# Altium schematic symbol library jlcpcb_2025_04_capacitors_extended_1206.schlib: 2503 symbols (part 13 of 14) (continued)
## TCC1206COG560J102ET
designator C?  Capacitance: 56pF  (hidden comment: *)
Capacitor, Ceramic (MLCC), 56pF, ±5%, 1kV, C0G, ±5%, SMD 1206; Manufacturer: CCTC; Manufacturer Part Number: TCC1206COG560J102ET; Package Size: 1206; JLCPCB Basic Part: No; JLCPCB Part Number: C377041; Supplier 1: LCSC; Category: Capacitors - MLCC; Supplier Part Number 1: C377041; Tolerance: ±5%; Voltage Rating: 1kV; Temperature Coefficient: C0G; RoHS: Yes; ComponentLink1Description: Datasheet; ComponentLink1URL: https://wmsc.lcsc.com/wmsc/upload/file/pdf/v2/lcsc/2304140030_CCTC-TCC1206COG560J102ET_C377041.pdf; ComponentLink2Description: JLCPCB Part URL; ComponentLink2URL: https://jlcpcb.com/partdetail/C377041; ComponentLink3Description: LCSC Part URL; ComponentLink3URL: https://lcsc.com/product-detail/Multilayer-Ceramic-Capacitors-MLCC---SMD-SMT_CCTC-CCTC-TCC1206COG560J102ET_C377041.html
footprint CAP-1206 (1206 (3216M) Capacitor)
pins: 1, 2

## TCC1206COG680J102DT
designator C?  Capacitance: 68pF  (hidden comment: *)
Capacitor, Ceramic (MLCC), 68pF, ±5%, 1kV, C0G, ±5%, SMD 1206; Manufacturer: CCTC; Manufacturer Part Number: TCC1206COG680J102DT; Package Size: 1206; JLCPCB Basic Part: No; JLCPCB Part Number: C377042; Supplier 1: LCSC; Category: Capacitors - MLCC; Supplier Part Number 1: C377042; Tolerance: ±5%; Voltage Rating: 1kV; Temperature Coefficient: C0G; RoHS: Yes; ComponentLink1Description: Datasheet; ComponentLink1URL: https://wmsc.lcsc.com/wmsc/upload/file/pdf/v2/lcsc/2304140030_CCTC-TCC1206COG680J102DT_C377042.pdf; ComponentLink2Description: JLCPCB Part URL; ComponentLink2URL: https://jlcpcb.com/partdetail/C377042; ComponentLink3Description: LCSC Part URL; ComponentLink3URL: https://lcsc.com/product-detail/Multilayer-Ceramic-Capacitors-MLCC---SMD-SMT_CCTC-CCTC-TCC1206COG680J102DT_C377042.html
footprint CAP-1206 (1206 (3216M) Capacitor)
pins: 1, 2

## TCC1206COG680J102ET
designator C?  Capacitance: 68pF  (hidden comment: *)
Capacitor, Ceramic (MLCC), 68pF, ±5%, 1kV, C0G, ±5%, SMD 1206; Manufacturer: CCTC; Manufacturer Part Number: TCC1206COG680J102ET; Package Size: 1206; JLCPCB Basic Part: No; JLCPCB Part Number: C377043; Supplier 1: LCSC; Category: Capacitors - MLCC; Supplier Part Number 1: C377043; Tolerance: ±5%; Voltage Rating: 1kV; Temperature Coefficient: C0G; RoHS: Yes; ComponentLink1Description: Datasheet; ComponentLink1URL: https://wmsc.lcsc.com/wmsc/upload/file/pdf/v2/lcsc/2304140030_CCTC-TCC1206COG680J102ET_C377043.pdf; ComponentLink2Description: JLCPCB Part URL; ComponentLink2URL: https://jlcpcb.com/partdetail/C377043; ComponentLink3Description: LCSC Part URL; ComponentLink3URL: https://lcsc.com/product-detail/Multilayer-Ceramic-Capacitors-MLCC---SMD-SMT_CCTC-CCTC-TCC1206COG680J102ET_C377043.html
footprint CAP-1206 (1206 (3216M) Capacitor)
pins: 1, 2

## TCC1206COG680J500DT
designator C?  Capacitance: 68pF  (hidden comment: *)
Capacitor, Ceramic (MLCC), 68pF, ±5%, 50V, C0G, ±5%, SMD 1206; Manufacturer: CCTC; Manufacturer Part Number: TCC1206COG680J500DT; Package Size: 1206; JLCPCB Basic Part: No; JLCPCB Part Number: C377044; Supplier 1: LCSC; Category: Capacitors - MLCC; Supplier Part Number 1: C377044; Tolerance: ±5%; Voltage Rating: 50V; Temperature Coefficient: C0G; RoHS: Yes; ComponentLink1Description: Datasheet; ComponentLink1URL: https://wmsc.lcsc.com/wmsc/upload/file/pdf/v2/lcsc/2304140030_CCTC-TCC1206COG680J500DT_C377044.pdf; ComponentLink2Description: JLCPCB Part URL; ComponentLink2URL: https://jlcpcb.com/partdetail/C377044; ComponentLink3Description: LCSC Part URL; ComponentLink3URL: https://lcsc.com/product-detail/Multilayer-Ceramic-Capacitors-MLCC---SMD-SMT_CCTC-CCTC-TCC1206COG680J500DT_C377044.html
footprint CAP-1206 (1206 (3216M) Capacitor)
pins: 1, 2

## TCC1206COG681J500DT
designator C?  Capacitance: 680pF  (hidden comment: *)
Capacitor, Ceramic (MLCC), 680pF, ±5%, 50V, C0G, ±5%, SMD 1206; Manufacturer: CCTC; Manufacturer Part Number: TCC1206COG681J500DT; Package Size: 1206; JLCPCB Basic Part: No; JLCPCB Part Number: C282803; Supplier 1: LCSC; Category: Capacitors - MLCC; Supplier Part Number 1: C282803; Tolerance: ±5%; Voltage Rating: 50V; Temperature Coefficient: C0G; RoHS: Yes; ComponentLink1Description: Datasheet; ComponentLink1URL: https://wmsc.lcsc.com/wmsc/upload/file/pdf/v2/lcsc/2304140030_CCTC-TCC1206COG681J500DT_C282803.pdf; ComponentLink2Description: JLCPCB Part URL; ComponentLink2URL: https://jlcpcb.com/partdetail/C282803; ComponentLink3Description: LCSC Part URL; ComponentLink3URL: https://lcsc.com/product-detail/Multilayer-Ceramic-Capacitors-MLCC---SMD-SMT_CCTC-CCTC-TCC1206COG681J500DT_C282803.html
footprint CAP-1206 (1206 (3216M) Capacitor)
pins: 1, 2

## TCC1206COG820J500DT
designator C?  Capacitance: 82pF  (hidden comment: *)
Capacitor, Ceramic (MLCC), 82pF, ±5%, 50V, C0G, ±5%, SMD 1206; Manufacturer: CCTC; Manufacturer Part Number: TCC1206COG820J500DT; Package Size: 1206; JLCPCB Basic Part: No; JLCPCB Part Number: C282806; Supplier 1: LCSC; Category: Capacitors - MLCC; Supplier Part Number 1: C282806; Tolerance: ±5%; Voltage Rating: 50V; Temperature Coefficient: C0G; RoHS: Yes; ComponentLink1Description: Datasheet; ComponentLink1URL: https://wmsc.lcsc.com/wmsc/upload/file/pdf/v2/lcsc/2304140030_CCTC-TCC1206COG820J500DT_C282806.pdf; ComponentLink2Description: JLCPCB Part URL; ComponentLink2URL: https://jlcpcb.com/partdetail/C282806; ComponentLink3Description: LCSC Part URL; ComponentLink3URL: https://lcsc.com/product-detail/Multilayer-Ceramic-Capacitors-MLCC---SMD-SMT_CCTC-CCTC-TCC1206COG820J500DT_C282806.html
footprint CAP-1206 (1206 (3216M) Capacitor)
pins: 1, 2

## TCC1206M3L104J500FT
designator C?  Capacitance: 100nF  (hidden comment: *)
Capacitor, Ceramic (MLCC), 100nF, ±5%, 50V, M3L, ±5%, SMD 1206; Manufacturer: CCTC; Manufacturer Part Number: TCC1206M3L104J500FT; Package Size: 1206; JLCPCB Basic Part: No; JLCPCB Part Number: C359189; Supplier 1: LCSC; Category: Capacitors - MLCC; Supplier Part Number 1: C359189; Tolerance: ±5%; Voltage Rating: 50V; Temperature Coefficient: M3L; RoHS: Yes; ComponentLink1Description: Datasheet; ComponentLink1URL: https://wmsc.lcsc.com/wmsc/upload/file/pdf/v2/lcsc/1912111437_CCTC-TCC1206M3L104J500FT_C359189.pdf; ComponentLink2Description: JLCPCB Part URL; ComponentLink2URL: https://jlcpcb.com/partdetail/C359189; ComponentLink3Description: LCSC Part URL; ComponentLink3URL: https://lcsc.com/product-detail/Multilayer-Ceramic-Capacitors-MLCC---SMD-SMT_CCTC-CCTC-TCC1206M3L104J500FT_C359189.html
footprint CAP-1206 (1206 (3216M) Capacitor)
pins: 1, 2

## TCC1206M3L473J500FT
designator C?  Capacitance: 47nF  (hidden comment: *)
Capacitor, Ceramic (MLCC), 47nF, ±5%, 50V, M3L, ±5%, SMD 1206; Manufacturer: CCTC; Manufacturer Part Number: TCC1206M3L473J500FT; Package Size: 1206; JLCPCB Basic Part: No; JLCPCB Part Number: C2903670; Supplier 1: LCSC; Category: Capacitors - MLCC; Supplier Part Number 1: C2903670; Tolerance: ±5%; Voltage Rating: 50V; Temperature Coefficient: M3L; RoHS: Yes; ComponentLink1Description: Datasheet; ComponentLink1URL: https://wmsc.lcsc.com/wmsc/upload/file/pdf/v2/lcsc/2110101130_CCTC-TCC1206M3L473J500FT_C2903670.pdf; ComponentLink2Description: JLCPCB Part URL; ComponentLink2URL: https://jlcpcb.com/partdetail/C2903670; ComponentLink3Description: LCSC Part URL; ComponentLink3URL: https://lcsc.com/product-detail/Multilayer-Ceramic-Capacitors-MLCC---SMD-SMT_CCTC-CCTC-TCC1206M3L473J500FT_C2903670.html
footprint CAP-1206 (1206 (3216M) Capacitor)
pins: 1, 2

## TCC1206M3L823J500FT
designator C?  Capacitance: 82nF  (hidden comment: *)
Capacitor, Ceramic (MLCC), 82nF, ±5%, 50V, M3L, ±5%, SMD 1206; Manufacturer: CCTC; Manufacturer Part Number: TCC1206M3L823J500FT; Package Size: 1206; JLCPCB Basic Part: No; JLCPCB Part Number: C7393979; Supplier 1: LCSC; Category: Capacitors - MLCC; Supplier Part Number 1: C7393979; Tolerance: ±5%; Voltage Rating: 50V; Temperature Coefficient: M3L; RoHS: Yes; ComponentLink1Description: Datasheet; ComponentLink1URL: https://wmsc.lcsc.com/wmsc/upload/file/pdf/v2/lcsc/2306211528_CCTC-TCC1206M3L823J500FT_C7393979.pdf; ComponentLink2Description: JLCPCB Part URL; ComponentLink2URL: https://jlcpcb.com/partdetail/C7393979; ComponentLink3Description: LCSC Part URL; ComponentLink3URL: https://lcsc.com/product-detail/Multilayer-Ceramic-Capacitors-MLCC---SMD-SMT_CCTC-CCTC-TCC1206M3L823J500FT_C7393979.html
footprint CAP-1206 (1206 (3216M) Capacitor)
pins: 1, 2

## TCC1206X5R226K160HT
designator C?  Capacitance: 22uF  (hidden comment: *)
Capacitor, Ceramic (MLCC), 22uF, ±10%, 16V, X5R, ±10%, SMD 1206; Manufacturer: CCTC; Manufacturer Part Number: TCC1206X5R226K160HT; Package Size: 1206; JLCPCB Basic Part: No; JLCPCB Part Number: C5448976; Supplier 1: LCSC; Category: Capacitors - MLCC; Supplier Part Number 1: C5448976; Tolerance: ±10%; Voltage Rating: 16V; Temperature Coefficient: X5R; RoHS: Yes; ComponentLink1Description: Datasheet; ComponentLink1URL: https://wmsc.lcsc.com/wmsc/upload/file/pdf/v2/lcsc/2403281713_CCTC-TCC1206X5R226K160HT_C5448976.pdf; ComponentLink2Description: JLCPCB Part URL; ComponentLink2URL: https://jlcpcb.com/partdetail/C5448976; ComponentLink3Description: LCSC Part URL; ComponentLink3URL: https://lcsc.com/product-detail/Multilayer-Ceramic-Capacitors-MLCC---SMD-SMT_CCTC-CCTC-TCC1206X5R226K160HT_C5448976.html
footprint CAP-1206 (1206 (3216M) Capacitor)
pins: 1, 2

## TCC1206X5R226K250HT
designator C?  Capacitance: 22uF  (hidden comment: *)
Capacitor, Ceramic (MLCC), 22uF, ±10%, 25V, X5R, ±10%, SMD 1206; Manufacturer: CCTC; Manufacturer Part Number: TCC1206X5R226K250HT; Package Size: 1206; JLCPCB Basic Part: No; JLCPCB Part Number: C5448922; Supplier 1: LCSC; Category: Capacitors - MLCC; Supplier Part Number 1: C5448922; Tolerance: ±10%; Voltage Rating: 25V; Temperature Coefficient: X5R; RoHS: Yes; ComponentLink1Description: Datasheet; ComponentLink1URL: https://wmsc.lcsc.com/wmsc/upload/file/pdf/v2/lcsc/2403281712_CCTC-TCC1206X5R226K250HT_C5448922.pdf; ComponentLink2Description: JLCPCB Part URL; ComponentLink2URL: https://jlcpcb.com/partdetail/C5448922; ComponentLink3Description: LCSC Part URL; ComponentLink3URL: https://lcsc.com/product-detail/Multilayer-Ceramic-Capacitors-MLCC---SMD-SMT_CCTC-CCTC-TCC1206X5R226K250HT_C5448922.html
footprint CAP-1206 (1206 (3216M) Capacitor)
pins: 1, 2

## TCC1206X5R475K160HT
designator C?  Capacitance: 4.7uF  (hidden comment: *)
Capacitor, Ceramic (MLCC), 4.7uF, ±10%, 16V, X5R, ±10%, SMD 1206; Manufacturer: CCTC; Manufacturer Part Number: TCC1206X5R475K160HT; Package Size: 1206; JLCPCB Basic Part: No; JLCPCB Part Number: C380360; Supplier 1: LCSC; Category: Capacitors - MLCC; Supplier Part Number 1: C380360; Tolerance: ±10%; Voltage Rating: 16V; Temperature Coefficient: X5R; RoHS: Yes; ComponentLink1Description: Datasheet; ComponentLink1URL: https://wmsc.lcsc.com/wmsc/upload/file/pdf/v2/lcsc/2304140030_CCTC-TCC1206X5R475K160HT_C380360.pdf; ComponentLink2Description: JLCPCB Part URL; ComponentLink2URL: https://jlcpcb.com/partdetail/C380360; ComponentLink3Description: LCSC Part URL; ComponentLink3URL: https://lcsc.com/product-detail/Multilayer-Ceramic-Capacitors-MLCC---SMD-SMT_CCTC-CCTC-TCC1206X5R475K160HT_C380360.html
footprint CAP-1206 (1206 (3216M) Capacitor)
pins: 1, 2

## TCC1206X5R475K250HT
designator C?  Capacitance: 4.7uF  (hidden comment: *)
Capacitor, Ceramic (MLCC), 4.7uF, ±10%, 25V, X5R, ±10%, SMD 1206; Manufacturer: CCTC; Manufacturer Part Number: TCC1206X5R475K250HT; Package Size: 1206; JLCPCB Basic Part: No; JLCPCB Part Number: C282809; Supplier 1: LCSC; Category: Capacitors - MLCC; Supplier Part Number 1: C282809; Tolerance: ±10%; Voltage Rating: 25V; Temperature Coefficient: X5R; RoHS: Yes; ComponentLink1Description: Datasheet; ComponentLink1URL: https://wmsc.lcsc.com/wmsc/upload/file/pdf/v2/lcsc/2304140030_CCTC-TCC1206X5R475K250HT_C282809.pdf; ComponentLink2Description: JLCPCB Part URL; ComponentLink2URL: https://jlcpcb.com/partdetail/C282809; ComponentLink3Description: LCSC Part URL; ComponentLink3URL: https://lcsc.com/product-detail/Multilayer-Ceramic-Capacitors-MLCC---SMD-SMT_CCTC-CCTC-TCC1206X5R475K250HT_C282809.html
footprint CAP-1206 (1206 (3216M) Capacitor)
pins: 1, 2

## TCC1206X5R476K100HT
designator C?  Capacitance: 47uF  (hidden comment: *)
Capacitor, Ceramic (MLCC), 47uF, ±10%, 10V, X5R, ±10%, SMD 1206; Manufacturer: CCTC; Manufacturer Part Number: TCC1206X5R476K100HT; Package Size: 1206; JLCPCB Basic Part: No; JLCPCB Part Number: C5449028; Supplier 1: LCSC; Category: Capacitors - MLCC; Supplier Part Number 1: C5449028; Tolerance: ±10%; Voltage Rating: 10V; Temperature Coefficient: X5R; RoHS: Yes; ComponentLink1Description: Datasheet; ComponentLink1URL: https://wmsc.lcsc.com/wmsc/upload/file/pdf/v2/lcsc/2403281713_CCTC-TCC1206X5R476K100HT_C5449028.pdf; ComponentLink2Description: JLCPCB Part URL; ComponentLink2URL: https://jlcpcb.com/partdetail/C5449028; ComponentLink3Description: LCSC Part URL; ComponentLink3URL: https://lcsc.com/product-detail/Multilayer-Ceramic-Capacitors-MLCC---SMD-SMT_CCTC-CCTC-TCC1206X5R476K100HT_C5449028.html
footprint CAP-1206 (1206 (3216M) Capacitor)
pins: 1, 2

## TCC1206X5R476M6R3HT
designator C?  Capacitance: 47uF  (hidden comment: *)
Capacitor, Ceramic (MLCC), 47uF, ±20%, 6.3V, X5R, ±20%, SMD 1206; Manufacturer: CCTC; Manufacturer Part Number: TCC1206X5R476M6R3HT; Package Size: 1206; JLCPCB Basic Part: No; JLCPCB Part Number: C380361; Supplier 1: LCSC; Category: Capacitors - MLCC; Supplier Part Number 1: C380361; Tolerance: ±20%; Voltage Rating: 6.3V; Temperature Coefficient: X5R; RoHS: Yes; ComponentLink1Description: Datasheet; ComponentLink1URL: https://wmsc.lcsc.com/wmsc/upload/file/pdf/v2/lcsc/2304140030_CCTC-TCC1206X5R476M6R3HT_C380361.pdf; ComponentLink2Description: JLCPCB Part URL; ComponentLink2URL: https://jlcpcb.com/partdetail/C380361; ComponentLink3Description: LCSC Part URL; ComponentLink3URL: https://lcsc.com/product-detail/Multilayer-Ceramic-Capacitors-MLCC---SMD-SMT_CCTC-CCTC-TCC1206X5R476M6R3HT_C380361.html
footprint CAP-1206 (1206 (3216M) Capacitor)
pins: 1, 2

## TCC1206X5R685K250HT
designator C?  Capacitance: 6.8uF  (hidden comment: *)
Capacitor, Ceramic (MLCC), 6.8uF, ±10%, 25V, X5R, ±10%, SMD 1206; Manufacturer: CCTC; Manufacturer Part Number: TCC1206X5R685K250HT; Package Size: 1206; JLCPCB Basic Part: No; JLCPCB Part Number: C7393982; Supplier 1: LCSC; Category: Capacitors - MLCC; Supplier Part Number 1: C7393982; Tolerance: ±10%; Voltage Rating: 25V; Temperature Coefficient: X5R; RoHS: Yes; ComponentLink1Description: Datasheet; ComponentLink1URL: https://wmsc.lcsc.com/wmsc/upload/file/pdf/v2/lcsc/2306211528_CCTC-TCC1206X5R685K250HT_C7393982.pdf; ComponentLink2Description: JLCPCB Part URL; ComponentLink2URL: https://jlcpcb.com/partdetail/C7393982; ComponentLink3Description: LCSC Part URL; ComponentLink3URL: https://lcsc.com/product-detail/Multilayer-Ceramic-Capacitors-MLCC---SMD-SMT_CCTC-CCTC-TCC1206X5R685K250HT_C7393982.html
footprint CAP-1206 (1206 (3216M) Capacitor)
pins: 1, 2

## TCC1206X7R101J102ET
designator C?  Capacitance: 100pF  (hidden comment: *)
Capacitor, Ceramic (MLCC), 100pF, ±5%, 1kV, X7R, ±5%, SMD 1206; Manufacturer: CCTC; Manufacturer Part Number: TCC1206X7R101J102ET; Package Size: 1206; JLCPCB Basic Part: No; JLCPCB Part Number: C377045; Supplier 1: LCSC; Category: Capacitors - MLCC; Supplier Part Number 1: C377045; Tolerance: ±5%; Voltage Rating: 1kV; Temperature Coefficient: X7R; RoHS: Yes; ComponentLink1Description: Datasheet; ComponentLink1URL: https://wmsc.lcsc.com/wmsc/upload/file/pdf/v2/lcsc/2304140030_CCTC-TCC1206X7R101J102ET_C377045.pdf; ComponentLink2Description: JLCPCB Part URL; ComponentLink2URL: https://jlcpcb.com/partdetail/C377045; ComponentLink3Description: LCSC Part URL; ComponentLink3URL: https://lcsc.com/product-detail/Multilayer-Ceramic-Capacitors-MLCC---SMD-SMT_CCTC-CCTC-TCC1206X7R101J102ET_C377045.html
footprint CAP-1206 (1206 (3216M) Capacitor)
pins: 1, 2

## TCC1206X7R101K102DT
designator C?  Capacitance: 100pF  (hidden comment: *)
Capacitor, Ceramic (MLCC), 100pF, ±10%, 1kV, X7R, ±10%, SMD 1206; Manufacturer: CCTC; Manufacturer Part Number: TCC1206X7R101K102DT; Package Size: 1206; JLCPCB Basic Part: No; JLCPCB Part Number: C377046; Supplier 1: LCSC; Category: Capacitors - MLCC; Supplier Part Number 1: C377046; Tolerance: ±10%; Voltage Rating: 1kV; Temperature Coefficient: X7R; RoHS: Yes; ComponentLink1Description: Datasheet; ComponentLink1URL: https://wmsc.lcsc.com/wmsc/upload/file/pdf/v2/lcsc/2304140030_CCTC-TCC1206X7R101K102DT_C377046.pdf; ComponentLink2Description: JLCPCB Part URL; ComponentLink2URL: https://jlcpcb.com/partdetail/C377046; ComponentLink3Description: LCSC Part URL; ComponentLink3URL: https://lcsc.com/product-detail/Multilayer-Ceramic-Capacitors-MLCC---SMD-SMT_CCTC-CCTC-TCC1206X7R101K102DT_C377046.html
footprint CAP-1206 (1206 (3216M) Capacitor)
pins: 1, 2

## TCC1206X7R102K101DT
designator C?  Capacitance: 1nF  (hidden comment: *)
Capacitor, Ceramic (MLCC), 1nF, ±10%, 100V, X7R, ±10%, SMD 1206; Manufacturer: CCTC; Manufacturer Part Number: TCC1206X7R102K101DT; Package Size: 1206; JLCPCB Basic Part: No; JLCPCB Part Number: C282810; Supplier 1: LCSC; Category: Capacitors - MLCC; Supplier Part Number 1: C282810; Tolerance: ±10%; Voltage Rating: 100V; Temperature Coefficient: X7R; RoHS: Yes; ComponentLink1Description: Datasheet; ComponentLink1URL: https://wmsc.lcsc.com/wmsc/upload/file/pdf/v2/lcsc/2304140030_CCTC-TCC1206X7R102K101DT_C282810.pdf; ComponentLink2Description: JLCPCB Part URL; ComponentLink2URL: https://jlcpcb.com/partdetail/C282810; ComponentLink3Description: LCSC Part URL; ComponentLink3URL: https://lcsc.com/product-detail/Multilayer-Ceramic-Capacitors-MLCC---SMD-SMT_CCTC-CCTC-TCC1206X7R102K101DT_C282810.html
footprint CAP-1206 (1206 (3216M) Capacitor)
pins: 1, 2

## TCC1206X7R102K102DTS
designator C?  Capacitance: 1nF  (hidden comment: *)
Capacitor, Ceramic (MLCC), 1nF, ±10%, 1kV, X7R, ±10%, SMD 1206; Manufacturer: CCTC; Manufacturer Part Number: TCC1206X7R102K102DTS; Package Size: 1206; JLCPCB Basic Part: No; JLCPCB Part Number: C282811; Supplier 1: LCSC; Category: Capacitors - MLCC; Supplier Part Number 1: C282811; Tolerance: ±10%; Voltage Rating: 1kV; Temperature Coefficient: X7R; RoHS: Yes; ComponentLink1Description: Datasheet; ComponentLink1URL: https://wmsc.lcsc.com/wmsc/upload/file/pdf/v2/lcsc/2304140030_CCTC-TCC1206X7R102K102DTS_C282811.pdf; ComponentLink2Description: JLCPCB Part URL; ComponentLink2URL: https://jlcpcb.com/partdetail/C282811; ComponentLink3Description: LCSC Part URL; ComponentLink3URL: https://lcsc.com/product-detail/Multilayer-Ceramic-Capacitors-MLCC---SMD-SMT_CCTC-CCTC-TCC1206X7R102K102DTS_C282811.html
footprint CAP-1206 (1206 (3216M) Capacitor)
pins: 1, 2

## TCC1206X7R102K102FT
designator C?  Capacitance: 1nF  (hidden comment: *)
Capacitor, Ceramic (MLCC), 1nF, ±10%, 1kV, X7R, ±10%, SMD 1206; Manufacturer: CCTC; Manufacturer Part Number: TCC1206X7R102K102FT; Package Size: 1206; JLCPCB Basic Part: No; JLCPCB Part Number: C282812; Supplier 1: LCSC; Category: Capacitors - MLCC; Supplier Part Number 1: C282812; Tolerance: ±10%; Voltage Rating: 1kV; Temperature Coefficient: X7R; RoHS: Yes; ComponentLink1Description: Datasheet; ComponentLink1URL: https://wmsc.lcsc.com/wmsc/upload/file/pdf/v2/lcsc/2304140030_CCTC-TCC1206X7R102K102FT_C282812.pdf; ComponentLink2Description: JLCPCB Part URL; ComponentLink2URL: https://jlcpcb.com/partdetail/C282812; ComponentLink3Description: LCSC Part URL; ComponentLink3URL: https://lcsc.com/product-detail/Multilayer-Ceramic-Capacitors-MLCC---SMD-SMT_CCTC-CCTC-TCC1206X7R102K102FT_C282812.html
footprint CAP-1206 (1206 (3216M) Capacitor)
pins: 1, 2

## TCC1206X7R102K202DTS
designator C?  Capacitance: 1nF  (hidden comment: *)
Capacitor, Ceramic (MLCC), 1nF, ±10%, 2kV, X7R, ±10%, SMD 1206; Manufacturer: CCTC; Manufacturer Part Number: TCC1206X7R102K202DTS; Package Size: 1206; JLCPCB Basic Part: No; JLCPCB Part Number: C282813; Supplier 1: LCSC; Category: Capacitors - MLCC; Supplier Part Number 1: C282813; Tolerance: ±10%; Voltage Rating: 2kV; Temperature Coefficient: X7R; RoHS: Yes; ComponentLink1Description: Datasheet; ComponentLink1URL: https://wmsc.lcsc.com/wmsc/upload/file/pdf/v2/lcsc/2304140030_CCTC-TCC1206X7R102K202DTS_C282813.pdf; ComponentLink2Description: JLCPCB Part URL; ComponentLink2URL: https://jlcpcb.com/partdetail/C282813; ComponentLink3Description: LCSC Part URL; ComponentLink3URL: https://lcsc.com/product-detail/Multilayer-Ceramic-Capacitors-MLCC---SMD-SMT_CCTC-CCTC-TCC1206X7R102K202DTS_C282813.html
footprint CAP-1206 (1206 (3216M) Capacitor)
pins: 1, 2

## TCC1206X7R102K202FT_C282815
designator C?  Capacitance: 1nF  (hidden comment: *)
Capacitor, Ceramic (MLCC), 1nF, ±10%, 2kV, X7R, ±10%, SMD 1206; Manufacturer: CCTC; Manufacturer Part Number: TCC1206X7R102K202FT; Package Size: 1206; JLCPCB Basic Part: No; JLCPCB Part Number: C282815; Supplier 1: LCSC; Category: Capacitors - MLCC; Supplier Part Number 1: C282815; Tolerance: ±10%; Voltage Rating: 2kV; Temperature Coefficient: X7R; RoHS: Yes; ComponentLink1Description: Datasheet; ComponentLink1URL: https://wmsc.lcsc.com/wmsc/upload/file/pdf/v2/lcsc/2304140030_CCTC-TCC1206X7R102K202FT_C282815.pdf; ComponentLink2Description: JLCPCB Part URL; ComponentLink2URL: https://jlcpcb.com/partdetail/C282815; ComponentLink3Description: LCSC Part URL; ComponentLink3URL: https://lcsc.com/product-detail/Multilayer-Ceramic-Capacitors-MLCC---SMD-SMT_CCTC-CCTC-TCC1206X7R102K202FT_C282815.html
footprint CAP-1206 (1206 (3216M) Capacitor)
pins: 1, 2

## TCC1206X7R102K202FT_C717608
designator C?  Capacitance: 1nF  (hidden comment: *)
Capacitor, Ceramic (MLCC), 1nF, ±10%, 2kV, X7R, ±10%, SMD 1206; Manufacturer: CCTC; Manufacturer Part Number: TCC1206X7R102K202FT; Package Size: 1206; JLCPCB Basic Part: No; JLCPCB Part Number: C717608; Supplier 1: LCSC; Category: Capacitors - MLCC; Supplier Part Number 1: C717608; Tolerance: ±10%; Voltage Rating: 2kV; Temperature Coefficient: X7R; RoHS: Yes; ComponentLink1Description: Datasheet; ComponentLink1URL: https://wmsc.lcsc.com/wmsc/upload/file/pdf/v2/lcsc/2304140030_CCTC-TCC1206X7R102K202FT_C717608.pdf; ComponentLink2Description: JLCPCB Part URL; ComponentLink2URL: https://jlcpcb.com/partdetail/C717608; ComponentLink3Description: LCSC Part URL; ComponentLink3URL: https://lcsc.com/product-detail/Multilayer-Ceramic-Capacitors-MLCC---SMD-SMT_CCTC-CCTC-TCC1206X7R102K202FT_C717608.html
footprint CAP-1206 (1206 (3216M) Capacitor)
pins: 1, 2

## TCC1206X7R102K500DT
designator C?  Capacitance: 1nF  (hidden comment: *)
Capacitor, Ceramic (MLCC), 1nF, ±10%, 50V, X7R, ±10%, SMD 1206; Manufacturer: CCTC; Manufacturer Part Number: TCC1206X7R102K500DT; Package Size: 1206; JLCPCB Basic Part: No; JLCPCB Part Number: C282817; Supplier 1: LCSC; Category: Capacitors - MLCC; Supplier Part Number 1: C282817; Tolerance: ±10%; Voltage Rating: 50V; Temperature Coefficient: X7R; RoHS: Yes; ComponentLink1Description: Datasheet; ComponentLink1URL: https://wmsc.lcsc.com/wmsc/upload/file/pdf/v2/lcsc/2304140030_CCTC-TCC1206X7R102K500DT_C282817.pdf; ComponentLink2Description: JLCPCB Part URL; ComponentLink2URL: https://jlcpcb.com/partdetail/C282817; ComponentLink3Description: LCSC Part URL; ComponentLink3URL: https://lcsc.com/product-detail/Multilayer-Ceramic-Capacitors-MLCC---SMD-SMT_CCTC-CCTC-TCC1206X7R102K500DT_C282817.html
footprint CAP-1206 (1206 (3216M) Capacitor)
pins: 1, 2

## TCC1206X7R102K500DTS
designator C?  Capacitance: 1nF  (hidden comment: *)
Capacitor, Ceramic (MLCC), 1nF, ±10%, 50V, X7R, ±10%, SMD 1206; Manufacturer: CCTC; Manufacturer Part Number: TCC1206X7R102K500DTS; Package Size: 1206; JLCPCB Basic Part: No; JLCPCB Part Number: C377051; Supplier 1: LCSC; Category: Capacitors - MLCC; Supplier Part Number 1: C377051; Tolerance: ±10%; Voltage Rating: 50V; Temperature Coefficient: X7R; RoHS: Yes; ComponentLink1Description: Datasheet; ComponentLink1URL: https://wmsc.lcsc.com/wmsc/upload/file/pdf/v2/lcsc/2304140030_CCTC-TCC1206X7R102K500DTS_C377051.pdf; ComponentLink2Description: JLCPCB Part URL; ComponentLink2URL: https://jlcpcb.com/partdetail/C377051; ComponentLink3Description: LCSC Part URL; ComponentLink3URL: https://lcsc.com/product-detail/Multilayer-Ceramic-Capacitors-MLCC---SMD-SMT_CCTC-CCTC-TCC1206X7R102K500DTS_C377051.html
footprint CAP-1206 (1206 (3216M) Capacitor)
pins: 1, 2

## TCC1206X7R102K501DT
designator C?  Capacitance: 1nF  (hidden comment: *)
Capacitor, Ceramic (MLCC), 1nF, ±10%, 500V, X7R, ±10%, SMD 1206; Manufacturer: CCTC; Manufacturer Part Number: TCC1206X7R102K501DT; Package Size: 1206; JLCPCB Basic Part: No; JLCPCB Part Number: C282818; Supplier 1: LCSC; Category: Capacitors - MLCC; Supplier Part Number 1: C282818; Tolerance: ±10%; Voltage Rating: 500V; Temperature Coefficient: X7R; RoHS: Yes; ComponentLink1Description: Datasheet; ComponentLink1URL: https://wmsc.lcsc.com/wmsc/upload/file/pdf/v2/lcsc/2304140030_CCTC-TCC1206X7R102K501DT_C282818.pdf; ComponentLink2Description: JLCPCB Part URL; ComponentLink2URL: https://jlcpcb.com/partdetail/C282818; ComponentLink3Description: LCSC Part URL; ComponentLink3URL: https://lcsc.com/product-detail/Multilayer-Ceramic-Capacitors-MLCC---SMD-SMT_CCTC-CCTC-TCC1206X7R102K501DT_C282818.html
footprint CAP-1206 (1206 (3216M) Capacitor)
pins: 1, 2

## TCC1206X7R102K501DTS
designator C?  Capacitance: 1nF  (hidden comment: *)
Capacitor, Ceramic (MLCC), 1nF, ±10%, 500V, X7R, ±10%, SMD 1206; Manufacturer: CCTC; Manufacturer Part Number: TCC1206X7R102K501DTS; Package Size: 1206; JLCPCB Basic Part: No; JLCPCB Part Number: C377052; Supplier 1: LCSC; Category: Capacitors - MLCC; Supplier Part Number 1: C377052; Tolerance: ±10%; Voltage Rating: 500V; Temperature Coefficient: X7R; RoHS: Yes; ComponentLink1Description: Datasheet; ComponentLink1URL: https://wmsc.lcsc.com/wmsc/upload/file/pdf/v2/lcsc/2304140030_CCTC-TCC1206X7R102K501DTS_C377052.pdf; ComponentLink2Description: JLCPCB Part URL; ComponentLink2URL: https://jlcpcb.com/partdetail/C377052; ComponentLink3Description: LCSC Part URL; ComponentLink3URL: https://lcsc.com/product-detail/Multilayer-Ceramic-Capacitors-MLCC---SMD-SMT_CCTC-CCTC-TCC1206X7R102K501DTS_C377052.html
footprint CAP-1206 (1206 (3216M) Capacitor)
pins: 1, 2

## TCC1206X7R102K501FT
designator C?  Capacitance: 1nF  (hidden comment: *)
Capacitor, Ceramic (MLCC), 1nF, ±10%, 500V, X7R, ±10%, SMD 1206; Manufacturer: CCTC; Manufacturer Part Number: TCC1206X7R102K501FT; Package Size: 1206; JLCPCB Basic Part: No; JLCPCB Part Number: C377053; Supplier 1: LCSC; Category: Capacitors - MLCC; Supplier Part Number 1: C377053; Tolerance: ±10%; Voltage Rating: 500V; Temperature Coefficient: X7R; RoHS: Yes; ComponentLink1Description: Datasheet; ComponentLink1URL: https://wmsc.lcsc.com/wmsc/upload/file/pdf/v2/lcsc/2304140030_CCTC-TCC1206X7R102K501FT_C377053.pdf; ComponentLink2Description: JLCPCB Part URL; ComponentLink2URL: https://jlcpcb.com/partdetail/C377053; ComponentLink3Description: LCSC Part URL; ComponentLink3URL: https://lcsc.com/product-detail/Multilayer-Ceramic-Capacitors-MLCC---SMD-SMT_CCTC-CCTC-TCC1206X7R102K501FT_C377053.html
footprint CAP-1206 (1206 (3216M) Capacitor)
pins: 1, 2

## TCC1206X7R102M102DTS
designator C?  Capacitance: 1nF  (hidden comment: *)
Capacitor, Ceramic (MLCC), 1nF, ±20%, 1kV, X7R, ±20%, SMD 1206; Manufacturer: CCTC; Manufacturer Part Number: TCC1206X7R102M102DTS; Package Size: 1206; JLCPCB Basic Part: No; JLCPCB Part Number: C377054; Supplier 1: LCSC; Category: Capacitors - MLCC; Supplier Part Number 1: C377054; Tolerance: ±20%; Voltage Rating: 1kV; Temperature Coefficient: X7R; RoHS: Yes; ComponentLink1Description: Datasheet; ComponentLink1URL: https://wmsc.lcsc.com/wmsc/upload/file/pdf/v2/lcsc/2304140030_CCTC-TCC1206X7R102M102DTS_C377054.pdf; ComponentLink2Description: JLCPCB Part URL; ComponentLink2URL: https://jlcpcb.com/partdetail/C377054; ComponentLink3Description: LCSC Part URL; ComponentLink3URL: https://lcsc.com/product-detail/Multilayer-Ceramic-Capacitors-MLCC---SMD-SMT_CCTC-CCTC-TCC1206X7R102M102DTS_C377054.html
footprint CAP-1206 (1206 (3216M) Capacitor)
pins: 1, 2

## TCC1206X7R102M102FT
designator C?  Capacitance: 1nF  (hidden comment: *)
Capacitor, Ceramic (MLCC), 1nF, ±20%, 1kV, X7R, ±20%, SMD 1206; Manufacturer: CCTC; Manufacturer Part Number: TCC1206X7R102M102FT; Package Size: 1206; JLCPCB Basic Part: No; JLCPCB Part Number: C5448988; Supplier 1: LCSC; Category: Capacitors - MLCC; Supplier Part Number 1: C5448988; Tolerance: ±20%; Voltage Rating: 1kV; Temperature Coefficient: X7R; RoHS: Yes; ComponentLink1Description: Datasheet; ComponentLink2Description: JLCPCB Part URL; ComponentLink2URL: https://jlcpcb.com/partdetail/C5448988; ComponentLink3Description: LCSC Part URL; ComponentLink3URL: https://lcsc.com/product-detail/Multilayer-Ceramic-Capacitors-MLCC---SMD-SMT_CCTC-CCTC-TCC1206X7R102M102FT_C5448988.html
footprint CAP-1206 (1206 (3216M) Capacitor)
pins: 1, 2

## TCC1206X7R102M500DT
designator C?  Capacitance: 1nF  (hidden comment: *)
Capacitor, Ceramic (MLCC), 1nF, ±20%, 50V, X7R, ±20%, SMD 1206; Manufacturer: CCTC; Manufacturer Part Number: TCC1206X7R102M500DT; Package Size: 1206; JLCPCB Basic Part: No; JLCPCB Part Number: C5448898; Supplier 1: LCSC; Category: Capacitors - MLCC; Supplier Part Number 1: C5448898; Tolerance: ±20%; Voltage Rating: 50V; Temperature Coefficient: X7R; RoHS: Yes; ComponentLink1Description: Datasheet; ComponentLink2Description: JLCPCB Part URL; ComponentLink2URL: https://jlcpcb.com/partdetail/C5448898; ComponentLink3Description: LCSC Part URL; ComponentLink3URL: https://lcsc.com/product-detail/Multilayer-Ceramic-Capacitors-MLCC---SMD-SMT_CCTC-CCTC-TCC1206X7R102M500DT_C5448898.html
footprint CAP-1206 (1206 (3216M) Capacitor)
pins: 1, 2

## TCC1206X7R103K101DT
designator C?  Capacitance: 10nF  (hidden comment: *)
Capacitor, Ceramic (MLCC), 10nF, ±10%, 100V, X7R, ±10%, SMD 1206; Manufacturer: CCTC; Manufacturer Part Number: TCC1206X7R103K101DT; Package Size: 1206; JLCPCB Basic Part: No; JLCPCB Part Number: C377055; Supplier 1: LCSC; Category: Capacitors - MLCC; Supplier Part Number 1: C377055; Tolerance: ±10%; Voltage Rating: 100V; Temperature Coefficient: X7R; RoHS: Yes; ComponentLink1Description: Datasheet; ComponentLink1URL: https://wmsc.lcsc.com/wmsc/upload/file/pdf/v2/lcsc/2304140030_CCTC-TCC1206X7R103K101DT_C377055.pdf; ComponentLink2Description: JLCPCB Part URL; ComponentLink2URL: https://jlcpcb.com/partdetail/C377055; ComponentLink3Description: LCSC Part URL; ComponentLink3URL: https://lcsc.com/product-detail/Multilayer-Ceramic-Capacitors-MLCC---SMD-SMT_CCTC-CCTC-TCC1206X7R103K101DT_C377055.html
footprint CAP-1206 (1206 (3216M) Capacitor)
pins: 1, 2

## TCC1206X7R103K101DTS
designator C?  Capacitance: 10nF  (hidden comment: *)
Capacitor, Ceramic (MLCC), 10nF, ±10%, 100V, X7R, ±10%, SMD 1206; Manufacturer: CCTC; Manufacturer Part Number: TCC1206X7R103K101DTS; Package Size: 1206; JLCPCB Basic Part: No; JLCPCB Part Number: C696870; Supplier 1: LCSC; Category: Capacitors - MLCC; Supplier Part Number 1: C696870; Tolerance: ±10%; Voltage Rating: 100V; Temperature Coefficient: X7R; RoHS: Yes; ComponentLink1Description: Datasheet; ComponentLink1URL: https://wmsc.lcsc.com/wmsc/upload/file/pdf/v2/lcsc/2304140030_CCTC-TCC1206X7R103K101DTS_C696870.pdf; ComponentLink2Description: JLCPCB Part URL; ComponentLink2URL: https://jlcpcb.com/partdetail/C696870; ComponentLink3Description: LCSC Part URL; ComponentLink3URL: https://lcsc.com/product-detail/Multilayer-Ceramic-Capacitors-MLCC---SMD-SMT_CCTC-CCTC-TCC1206X7R103K101DTS_C696870.html
footprint CAP-1206 (1206 (3216M) Capacitor)
pins: 1, 2

## TCC1206X7R103K102FT
designator C?  Capacitance: 10nF  (hidden comment: *)
Capacitor, Ceramic (MLCC), 10nF, ±10%, 1kV, X7R, ±10%, SMD 1206; Manufacturer: CCTC; Manufacturer Part Number: TCC1206X7R103K102FT; Package Size: 1206; JLCPCB Basic Part: No; JLCPCB Part Number: C344191; Supplier 1: LCSC; Category: Capacitors - MLCC; Supplier Part Number 1: C344191; Tolerance: ±10%; Voltage Rating: 1kV; Temperature Coefficient: X7R; RoHS: Yes; ComponentLink1Description: Datasheet; ComponentLink1URL: https://wmsc.lcsc.com/wmsc/upload/file/pdf/v2/lcsc/2304140030_CCTC-TCC1206X7R103K102FT_C344191.pdf; ComponentLink2Description: JLCPCB Part URL; ComponentLink2URL: https://jlcpcb.com/partdetail/C344191; ComponentLink3Description: LCSC Part URL; ComponentLink3URL: https://lcsc.com/product-detail/Multilayer-Ceramic-Capacitors-MLCC---SMD-SMT_CCTC-CCTC-TCC1206X7R103K102FT_C344191.html
footprint CAP-1206 (1206 (3216M) Capacitor)
pins: 1, 2

## TCC1206X7R103K102FTS
designator C?  Capacitance: 10nF  (hidden comment: *)
Capacitor, Ceramic (MLCC), 10nF, ±10%, 1kV, X7R, ±10%, SMD 1206; Manufacturer: CCTC; Manufacturer Part Number: TCC1206X7R103K102FTS; Package Size: 1206; JLCPCB Basic Part: No; JLCPCB Part Number: C377056; Supplier 1: LCSC; Category: Capacitors - MLCC; Supplier Part Number 1: C377056; Tolerance: ±10%; Voltage Rating: 1kV; Temperature Coefficient: X7R; RoHS: Yes; ComponentLink1Description: Datasheet; ComponentLink1URL: https://wmsc.lcsc.com/wmsc/upload/file/pdf/v2/lcsc/2304140030_CCTC-TCC1206X7R103K102FTS_C377056.pdf; ComponentLink2Description: JLCPCB Part URL; ComponentLink2URL: https://jlcpcb.com/partdetail/C377056; ComponentLink3Description: LCSC Part URL; ComponentLink3URL: https://lcsc.com/product-detail/Multilayer-Ceramic-Capacitors-MLCC---SMD-SMT_CCTC-CCTC-TCC1206X7R103K102FTS_C377056.html
footprint CAP-1206 (1206 (3216M) Capacitor)
pins: 1, 2

## TCC1206X7R103K201DTS
designator C?  Capacitance: 10nF  (hidden comment: *)
Capacitor, Ceramic (MLCC), 10nF, ±10%, 200V, X7R, ±10%, SMD 1206; Manufacturer: CCTC; Manufacturer Part Number: TCC1206X7R103K201DTS; Package Size: 1206; JLCPCB Basic Part: No; JLCPCB Part Number: C344199; Supplier 1: LCSC; Category: Capacitors - MLCC; Supplier Part Number 1: C344199; Tolerance: ±10%; Voltage Rating: 200V; Temperature Coefficient: X7R; RoHS: Yes; ComponentLink1Description: Datasheet; ComponentLink1URL: https://wmsc.lcsc.com/wmsc/upload/file/pdf/v2/lcsc/2304140030_CCTC-TCC1206X7R103K201DTS_C344199.pdf; ComponentLink2Description: JLCPCB Part URL; ComponentLink2URL: https://jlcpcb.com/partdetail/C344199; ComponentLink3Description: LCSC Part URL; ComponentLink3URL: https://lcsc.com/product-detail/Multilayer-Ceramic-Capacitors-MLCC---SMD-SMT_CCTC-CCTC-TCC1206X7R103K201DTS_C344199.html
footprint CAP-1206 (1206 (3216M) Capacitor)
pins: 1, 2

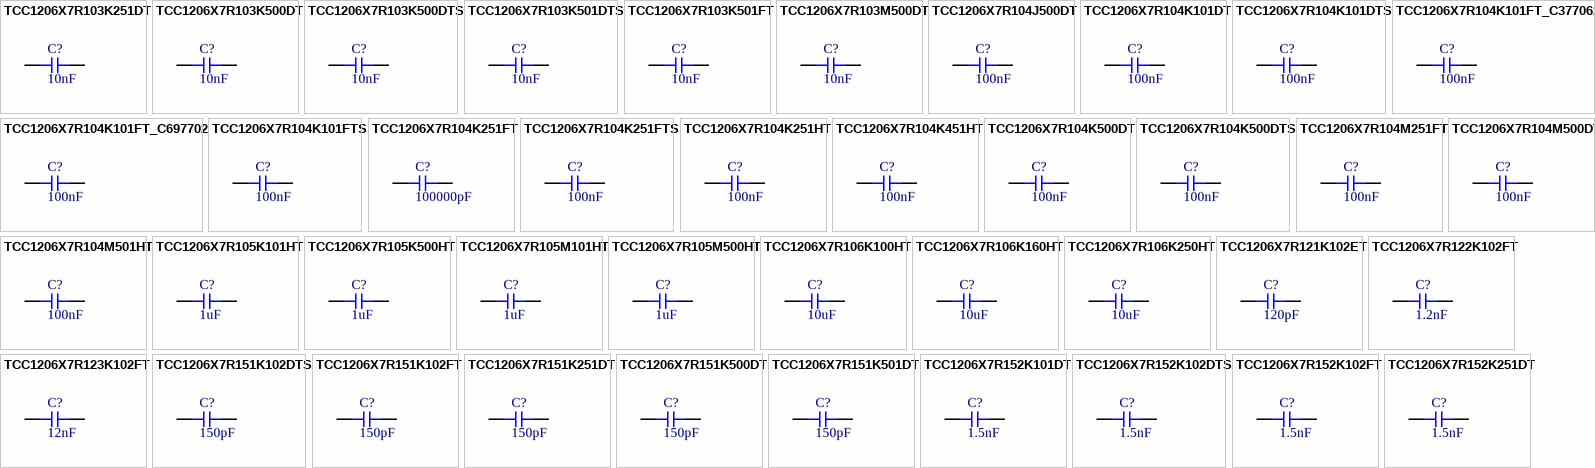
[diagram p58: symbols TCC1206X7R103K251DT to TCC1206X7R152K251DT]

## TCC1206X7R103K251DT
designator C?  Capacitance: 10nF  (hidden comment: *)
Capacitor, Ceramic (MLCC), 10nF, ±10%, 250V, X7R, ±10%, SMD 1206; Manufacturer: CCTC; Manufacturer Part Number: TCC1206X7R103K251DT; Package Size: 1206; JLCPCB Basic Part: No; JLCPCB Part Number: C344175; Supplier 1: LCSC; Category: Capacitors - MLCC; Supplier Part Number 1: C344175; Tolerance: ±10%; Voltage Rating: 250V; Temperature Coefficient: X7R; RoHS: Yes; ComponentLink1Description: Datasheet; ComponentLink1URL: https://wmsc.lcsc.com/wmsc/upload/file/pdf/v2/lcsc/2304140030_CCTC-TCC1206X7R103K251DT_C344175.pdf; ComponentLink2Description: JLCPCB Part URL; ComponentLink2URL: https://jlcpcb.com/partdetail/C344175; ComponentLink3Description: LCSC Part URL; ComponentLink3URL: https://lcsc.com/product-detail/Multilayer-Ceramic-Capacitors-MLCC---SMD-SMT_CCTC-CCTC-TCC1206X7R103K251DT_C344175.html
footprint CAP-1206 (1206 (3216M) Capacitor)
pins: 1, 2

## TCC1206X7R103K500DT
designator C?  Capacitance: 10nF  (hidden comment: *)
Capacitor, Ceramic (MLCC), 10nF, ±10%, 50V, X7R, ±10%, SMD 1206; Manufacturer: CCTC; Manufacturer Part Number: TCC1206X7R103K500DT; Package Size: 1206; JLCPCB Basic Part: No; JLCPCB Part Number: C377057; Supplier 1: LCSC; Category: Capacitors - MLCC; Supplier Part Number 1: C377057; Tolerance: ±10%; Voltage Rating: 50V; Temperature Coefficient: X7R; RoHS: Yes; ComponentLink1Description: Datasheet; ComponentLink1URL: https://wmsc.lcsc.com/wmsc/upload/file/pdf/v2/lcsc/2304140030_CCTC-TCC1206X7R103K500DT_C377057.pdf; ComponentLink2Description: JLCPCB Part URL; ComponentLink2URL: https://jlcpcb.com/partdetail/C377057; ComponentLink3Description: LCSC Part URL; ComponentLink3URL: https://lcsc.com/product-detail/Multilayer-Ceramic-Capacitors-MLCC---SMD-SMT_CCTC-CCTC-TCC1206X7R103K500DT_C377057.html
footprint CAP-1206 (1206 (3216M) Capacitor)
pins: 1, 2

## TCC1206X7R103K500DTS
designator C?  Capacitance: 10nF  (hidden comment: *)
Capacitor, Ceramic (MLCC), 10nF, ±10%, 50V, X7R, ±10%, SMD 1206; Manufacturer: CCTC; Manufacturer Part Number: TCC1206X7R103K500DTS; Package Size: 1206; JLCPCB Basic Part: No; JLCPCB Part Number: C880613; Supplier 1: LCSC; Category: Capacitors - MLCC; Supplier Part Number 1: C880613; Tolerance: ±10%; Voltage Rating: 50V; Temperature Coefficient: X7R; RoHS: Yes; ComponentLink1Description: Datasheet; ComponentLink1URL: https://wmsc.lcsc.com/wmsc/upload/file/pdf/v2/lcsc/2304140030_CCTC-TCC1206X7R103K500DTS_C880613.pdf; ComponentLink2Description: JLCPCB Part URL; ComponentLink2URL: https://jlcpcb.com/partdetail/C880613; ComponentLink3Description: LCSC Part URL; ComponentLink3URL: https://lcsc.com/product-detail/Multilayer-Ceramic-Capacitors-MLCC---SMD-SMT_CCTC-CCTC-TCC1206X7R103K500DTS_C880613.html
footprint CAP-1206 (1206 (3216M) Capacitor)
pins: 1, 2

## TCC1206X7R103K501DTS
designator C?  Capacitance: 10nF  (hidden comment: *)
Capacitor, Ceramic (MLCC), 10nF, ±10%, 500V, X7R, ±10%, SMD 1206; Manufacturer: CCTC; Manufacturer Part Number: TCC1206X7R103K501DTS; Package Size: 1206; JLCPCB Basic Part: No; JLCPCB Part Number: C377058; Supplier 1: LCSC; Category: Capacitors - MLCC; Supplier Part Number 1: C377058; Tolerance: ±10%; Voltage Rating: 500V; Temperature Coefficient: X7R; RoHS: Yes; ComponentLink1Description: Datasheet; ComponentLink1URL: https://wmsc.lcsc.com/wmsc/upload/file/pdf/v2/lcsc/2304140030_CCTC-TCC1206X7R103K501DTS_C377058.pdf; ComponentLink2Description: JLCPCB Part URL; ComponentLink2URL: https://jlcpcb.com/partdetail/C377058; ComponentLink3Description: LCSC Part URL; ComponentLink3URL: https://lcsc.com/product-detail/Multilayer-Ceramic-Capacitors-MLCC---SMD-SMT_CCTC-CCTC-TCC1206X7R103K501DTS_C377058.html
footprint CAP-1206 (1206 (3216M) Capacitor)
pins: 1, 2

## TCC1206X7R103K501FT
designator C?  Capacitance: 10nF  (hidden comment: *)
Capacitor, Ceramic (MLCC), 10nF, ±10%, 500V, X7R, ±10%, SMD 1206; Manufacturer: CCTC; Manufacturer Part Number: TCC1206X7R103K501FT; Package Size: 1206; JLCPCB Basic Part: No; JLCPCB Part Number: C282819; Supplier 1: LCSC; Category: Capacitors - MLCC; Supplier Part Number 1: C282819; Tolerance: ±10%; Voltage Rating: 500V; Temperature Coefficient: X7R; RoHS: Yes; ComponentLink1Description: Datasheet; ComponentLink1URL: https://wmsc.lcsc.com/wmsc/upload/file/pdf/v2/lcsc/2304140030_CCTC-TCC1206X7R103K501FT_C282819.pdf; ComponentLink2Description: JLCPCB Part URL; ComponentLink2URL: https://jlcpcb.com/partdetail/C282819; ComponentLink3Description: LCSC Part URL; ComponentLink3URL: https://lcsc.com/product-detail/Multilayer-Ceramic-Capacitors-MLCC---SMD-SMT_CCTC-CCTC-TCC1206X7R103K501FT_C282819.html
footprint CAP-1206 (1206 (3216M) Capacitor)
pins: 1, 2

## TCC1206X7R103M500DT
designator C?  Capacitance: 10nF  (hidden comment: *)
Capacitor, Ceramic (MLCC), 10nF, ±20%, 50V, X7R, ±20%, SMD 1206; Manufacturer: CCTC; Manufacturer Part Number: TCC1206X7R103M500DT; Package Size: 1206; JLCPCB Basic Part: No; JLCPCB Part Number: C2760547; Supplier 1: LCSC; Category: Capacitors - MLCC; Supplier Part Number 1: C2760547; Tolerance: ±20%; Voltage Rating: 50V; Temperature Coefficient: X7R; RoHS: Yes; ComponentLink1Description: Datasheet; ComponentLink1URL: https://wmsc.lcsc.com/wmsc/upload/file/pdf/v2/lcsc/2304140030_CCTC-TCC1206X7R103M500DT_C2760547.pdf; ComponentLink2Description: JLCPCB Part URL; ComponentLink2URL: https://jlcpcb.com/partdetail/C2760547; ComponentLink3Description: LCSC Part URL; ComponentLink3URL: https://lcsc.com/product-detail/Multilayer-Ceramic-Capacitors-MLCC---SMD-SMT_CCTC-CCTC-TCC1206X7R103M500DT_C2760547.html
footprint CAP-1206 (1206 (3216M) Capacitor)
pins: 1, 2

## TCC1206X7R104J500DT
designator C?  Capacitance: 100nF  (hidden comment: *)
Capacitor, Ceramic (MLCC), 100nF, ±5%, 50V, X7R, ±5%, SMD 1206; Manufacturer: CCTC; Manufacturer Part Number: TCC1206X7R104J500DT; Package Size: 1206; JLCPCB Basic Part: No; JLCPCB Part Number: C377060; Supplier 1: LCSC; Category: Capacitors - MLCC; Supplier Part Number 1: C377060; Tolerance: ±5%; Voltage Rating: 50V; Temperature Coefficient: X7R; RoHS: Yes; ComponentLink1Description: Datasheet; ComponentLink1URL: https://wmsc.lcsc.com/wmsc/upload/file/pdf/v2/lcsc/2304140030_CCTC-TCC1206X7R104J500DT_C377060.pdf; ComponentLink2Description: JLCPCB Part URL; ComponentLink2URL: https://jlcpcb.com/partdetail/C377060; ComponentLink3Description: LCSC Part URL; ComponentLink3URL: https://lcsc.com/product-detail/Multilayer-Ceramic-Capacitors-MLCC---SMD-SMT_CCTC-CCTC-TCC1206X7R104J500DT_C377060.html
footprint CAP-1206 (1206 (3216M) Capacitor)
pins: 1, 2

## TCC1206X7R104K101DT
designator C?  Capacitance: 100nF  (hidden comment: *)
Capacitor, Ceramic (MLCC), 100nF, ±10%, 100V, X7R, ±10%, SMD 1206; Manufacturer: CCTC; Manufacturer Part Number: TCC1206X7R104K101DT; Package Size: 1206; JLCPCB Basic Part: No; JLCPCB Part Number: C377061; Supplier 1: LCSC; Category: Capacitors - MLCC; Supplier Part Number 1: C377061; Tolerance: ±10%; Voltage Rating: 100V; Temperature Coefficient: X7R; RoHS: Yes; ComponentLink1Description: Datasheet; ComponentLink1URL: https://wmsc.lcsc.com/wmsc/upload/file/pdf/v2/lcsc/2304140030_CCTC-TCC1206X7R104K101DT_C377061.pdf; ComponentLink2Description: JLCPCB Part URL; ComponentLink2URL: https://jlcpcb.com/partdetail/C377061; ComponentLink3Description: LCSC Part URL; ComponentLink3URL: https://lcsc.com/product-detail/Multilayer-Ceramic-Capacitors-MLCC---SMD-SMT_CCTC-CCTC-TCC1206X7R104K101DT_C377061.html
footprint CAP-1206 (1206 (3216M) Capacitor)
pins: 1, 2

## TCC1206X7R104K101DTS
designator C?  Capacitance: 100nF  (hidden comment: *)
Capacitor, Ceramic (MLCC), 100nF, ±10%, 100V, X7R, ±10%, SMD 1206; Manufacturer: CCTC; Manufacturer Part Number: TCC1206X7R104K101DTS; Package Size: 1206; JLCPCB Basic Part: No; JLCPCB Part Number: C696845; Supplier 1: LCSC; Category: Capacitors - MLCC; Supplier Part Number 1: C696845; Tolerance: ±10%; Voltage Rating: 100V; Temperature Coefficient: X7R; RoHS: Yes; ComponentLink1Description: Datasheet; ComponentLink1URL: https://wmsc.lcsc.com/wmsc/upload/file/pdf/v2/lcsc/2304140030_CCTC-TCC1206X7R104K101DTS_C696845.pdf; ComponentLink2Description: JLCPCB Part URL; ComponentLink2URL: https://jlcpcb.com/partdetail/C696845; ComponentLink3Description: LCSC Part URL; ComponentLink3URL: https://lcsc.com/product-detail/Multilayer-Ceramic-Capacitors-MLCC---SMD-SMT_CCTC-CCTC-TCC1206X7R104K101DTS_C696845.html
footprint CAP-1206 (1206 (3216M) Capacitor)
pins: 1, 2

## TCC1206X7R104K101FT_C377062
designator C?  Capacitance: 100nF  (hidden comment: *)
Capacitor, Ceramic (MLCC), 100nF, ±10%, 100V, X7R, ±10%, SMD 1206; Manufacturer: CCTC; Manufacturer Part Number: TCC1206X7R104K101FT; Package Size: 1206; JLCPCB Basic Part: No; JLCPCB Part Number: C377062; Supplier 1: LCSC; Category: Capacitors - MLCC; Supplier Part Number 1: C377062; Tolerance: ±10%; Voltage Rating: 100V; Temperature Coefficient: X7R; RoHS: Yes; ComponentLink1Description: Datasheet; ComponentLink1URL: https://wmsc.lcsc.com/wmsc/upload/file/pdf/v2/lcsc/2304140030_CCTC-TCC1206X7R104K101FT_C377062.pdf; ComponentLink2Description: JLCPCB Part URL; ComponentLink2URL: https://jlcpcb.com/partdetail/C377062; ComponentLink3Description: LCSC Part URL; ComponentLink3URL: https://lcsc.com/product-detail/Multilayer-Ceramic-Capacitors-MLCC---SMD-SMT_CCTC-CCTC-TCC1206X7R104K101FT_C377062.html
footprint CAP-1206 (1206 (3216M) Capacitor)
pins: 1, 2

## TCC1206X7R104K101FT_C697702
designator C?  Capacitance: 100nF  (hidden comment: *)
Capacitor, Ceramic (MLCC), 100nF, ±10%, 100V, X7R, ±10%, SMD 1206; Manufacturer: CCTC; Manufacturer Part Number: TCC1206X7R104K101FT; Package Size: 1206; JLCPCB Basic Part: No; JLCPCB Part Number: C697702; Supplier 1: LCSC; Category: Capacitors - MLCC; Supplier Part Number 1: C697702; Tolerance: ±10%; Voltage Rating: 100V; Temperature Coefficient: X7R; RoHS: Yes; ComponentLink1Description: Datasheet; ComponentLink1URL: https://wmsc.lcsc.com/wmsc/upload/file/pdf/v2/lcsc/2304140030_CCTC-TCC1206X7R104K101FT_C697702.pdf; ComponentLink2Description: JLCPCB Part URL; ComponentLink2URL: https://jlcpcb.com/partdetail/C697702; ComponentLink3Description: LCSC Part URL; ComponentLink3URL: https://lcsc.com/product-detail/Multilayer-Ceramic-Capacitors-MLCC---SMD-SMT_CCTC-CCTC-TCC1206X7R104K101FT_C697702.html
footprint CAP-1206 (1206 (3216M) Capacitor)
pins: 1, 2

## TCC1206X7R104K101FTS
designator C?  Capacitance: 100nF  (hidden comment: *)
Capacitor, Ceramic (MLCC), 100nF, ±10%, 100V, X7R, ±10%, SMD 1206; Manufacturer: CCTC; Manufacturer Part Number: TCC1206X7R104K101FTS; Package Size: 1206; JLCPCB Basic Part: No; JLCPCB Part Number: C377063; Supplier 1: LCSC; Category: Capacitors - MLCC; Supplier Part Number 1: C377063; Tolerance: ±10%; Voltage Rating: 100V; Temperature Coefficient: X7R; RoHS: Yes; ComponentLink1Description: Datasheet; ComponentLink1URL: https://wmsc.lcsc.com/wmsc/upload/file/pdf/v2/lcsc/2304140030_CCTC-TCC1206X7R104K101FTS_C377063.pdf; ComponentLink2Description: JLCPCB Part URL; ComponentLink2URL: https://jlcpcb.com/partdetail/C377063; ComponentLink3Description: LCSC Part URL; ComponentLink3URL: https://lcsc.com/product-detail/Multilayer-Ceramic-Capacitors-MLCC---SMD-SMT_CCTC-CCTC-TCC1206X7R104K101FTS_C377063.html
footprint CAP-1206 (1206 (3216M) Capacitor)
pins: 1, 2

## TCC1206X7R104K251FT
designator C?  Capacitance: 100000pF  (hidden comment: *)
Capacitor, Ceramic (MLCC), 100000pF, ±10%, 250V, X7R, ±10%, SMD 1206; Manufacturer: CCTC; Manufacturer Part Number: TCC1206X7R104K251FT; Package Size: 1206; JLCPCB Basic Part: No; JLCPCB Part Number: C2858367; Supplier 1: LCSC; Category: Capacitors - MLCC; Supplier Part Number 1: C2858367; Tolerance: ±10%; Voltage Rating: 250V; Temperature Coefficient: X7R; RoHS: Yes; ComponentLink1Description: Datasheet; ComponentLink1URL: https://wmsc.lcsc.com/wmsc/upload/file/pdf/v2/lcsc/2403281708_CCTC-TCC1206X7R104K251FT_C2858367.pdf; ComponentLink2Description: JLCPCB Part URL; ComponentLink2URL: https://jlcpcb.com/partdetail/C2858367; ComponentLink3Description: LCSC Part URL; ComponentLink3URL: https://lcsc.com/product-detail/Multilayer-Ceramic-Capacitors-MLCC---SMD-SMT_CCTC-CCTC-TCC1206X7R104K251FT_C2858367.html
footprint CAP-1206 (1206 (3216M) Capacitor)
pins: 1, 2
